# Altium footprint library self_pcblib v1.8.6.PcbLib: 123 footprints (part 1 of 8)
Each footprint in its own frame and in the unit in brackets; x right, y up, seen from the top. Pads: shape width x height; smd on the part's side, far side on the other; paste and mask are expansions set on the pad; w line width, h text height; cw(c..) or ccw(c..) is an arc to the next point about the centre after c.
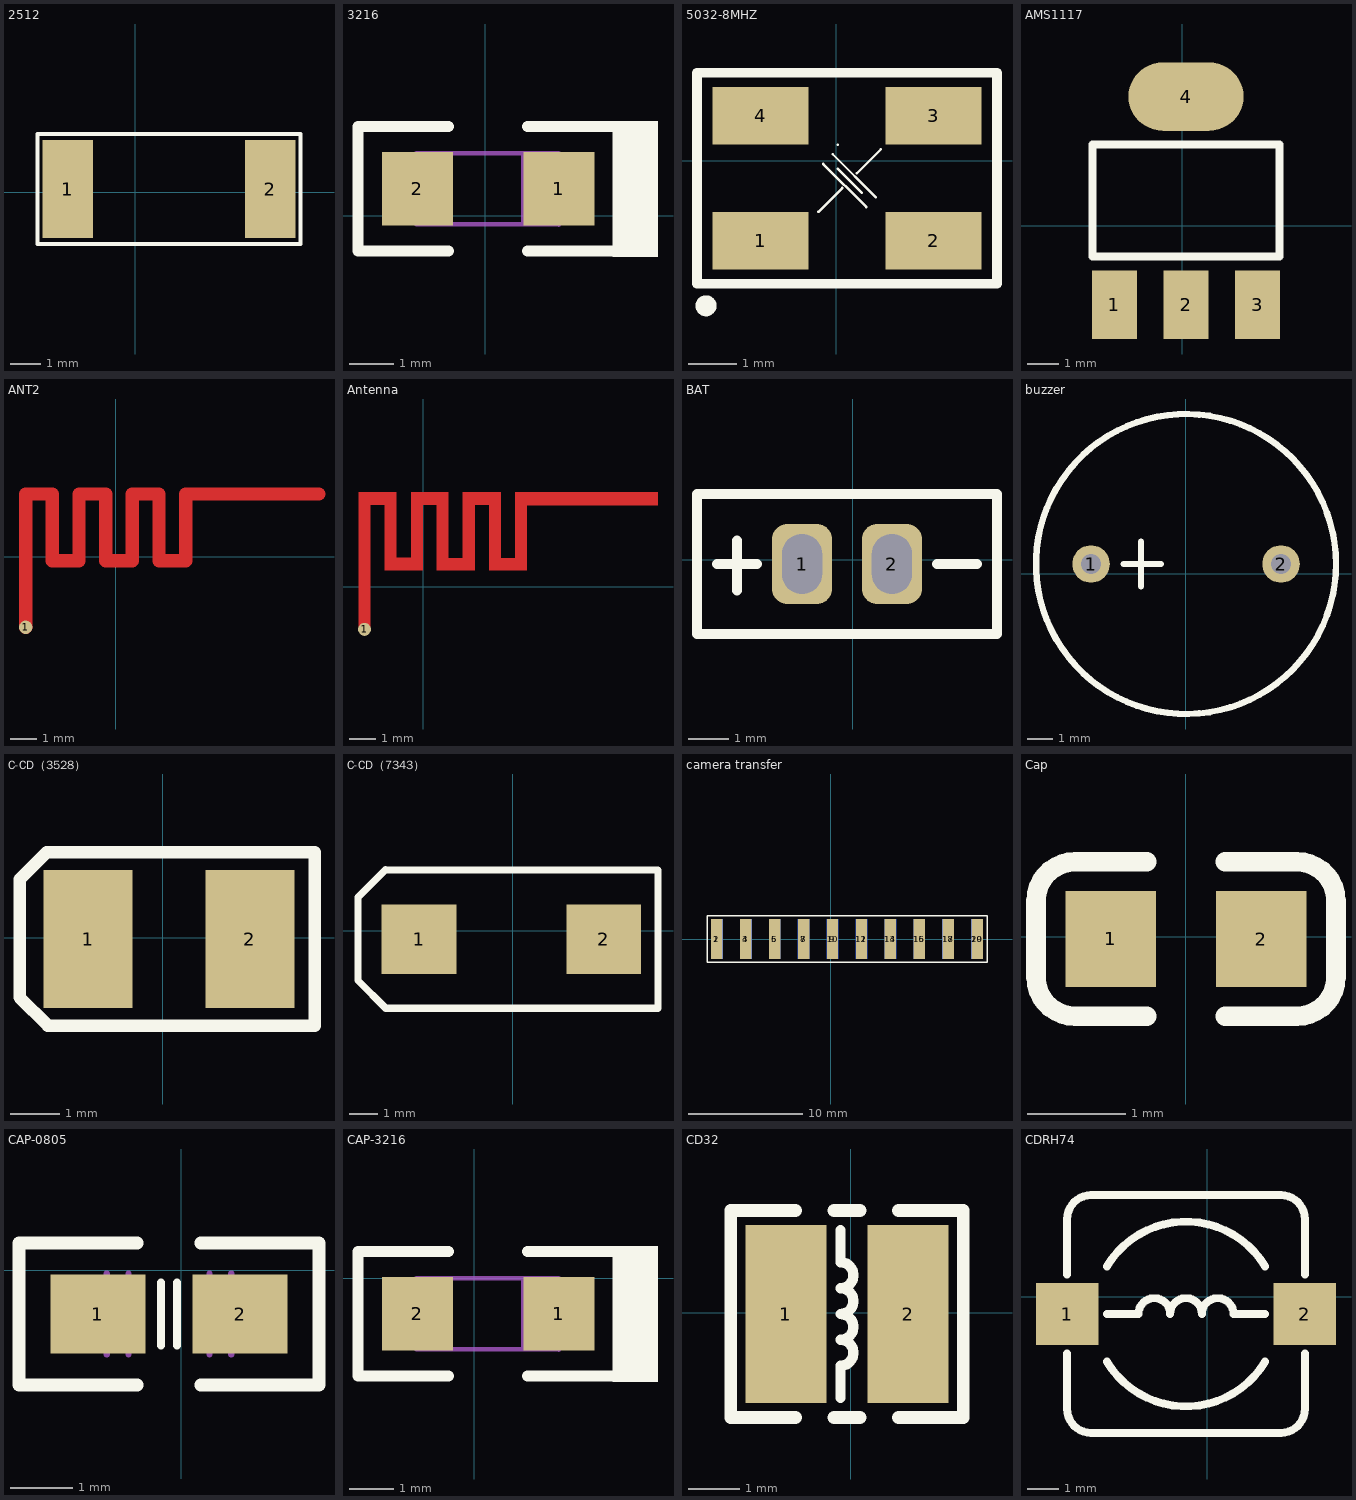
[diagram p0: the footprints below, top view; thin cyan lines are the x and y axes]

## 2512 [mm]
pads (2):
  rect 1.65x3.2 smd: 1(-2.2,0.1) 2(4.4,0.1)
Top Overlay:
  lines w0.127: -3.2,-1.7 5.4,-1.7 5.4,1.9 -3.2,1.9 -3.2,-1.7

## 3216 [mm]
pads (2):
  rect 1.6x1.65 smd: 1(1.659,0.608) 2(-1.516,0.608)
Top Overlay:
  rectangle: 2.866,-0.929 3.882,2.132
  lines w0.254: -0.817,-0.789 -2.849,-0.789 -2.849,2.005 -0.817,2.005 ; 0.961,-0.789 2.866,-0.789 ; 0.961,2.005 2.866,2.005
Mechanical 1:
  lines w0.1: -1.567,-0.002 -1.719,-0.002 -1.719,1.116 -1.541,1.116 ; 0.859,-0.192 0.859,1.408 ; 1.659,-0.205 1.659,-0.027 ; 1.659,-0.192 -1.541,-0.192 -1.541,1.408 1.659,1.408 1.659,-0.027 ; 1.684,1.116 1.862,1.116 1.837,1.091 1.837,-0.027 1.659,-0.027
3D body "3216-_A_钽电容.step": height 1.8, standoff 0, extent -1.692,-0.332 1.708,1.468

## 5032-8MHZ [mm]
pads (4):
  rect 2x1.2 smd: 1(-1.568,-1.667) 2(2.032,-1.667) 3(2.032,0.933) 4(-1.568,0.933)
Top Overlay:
  circle w0.254: c-2.708,-3.023 r0.092
  lines w0.051: -0.368,-1.067 0.132,-0.567 ; -0.268,-0.067 0.632,-0.967 ; -0.068,0.133 0.832,-0.767 ; 0.032,-0.167 0.532,-0.667 ; 0.432,-0.267 0.932,0.233 ; 0.132,-0.567 0.132,-0.567 ; 0.932,0.233 0.932,0.233 ; 0.032,0.333 0.032,0.333
  lines w0.203: -2.896,-2.565 3.353,-2.565 3.353,1.829 -2.896,1.829 -2.896,-2.565
3D body "User Library-crystal_smd_52x34x1.STEP": height 1, standoff 0, extent -2.371,-2.083 2.829,1.317

## AMS1117 [mm]
pads (4):
  rect 1.45x2.2 smd: 1(-2.173,-2.54) 2(0.127,-2.54) 3(2.427,-2.54)
  oval 3.7x2.2 smd: 4(0.127,4.155)
Top Overlay:
  lines w0.254: -2.873,-0.992 3.127,-0.992 3.127,2.607 -2.873,2.607 -2.873,-0.992
3D body "User Library-AMS1117.STEP": height 1.85, standoff -0.01, extent -3.175,-2.763 3.325,4.237

## ANT2 [mm]
pads (1):
  round 0.5 smd: 1(-3.378,-2.642)
Top Layer:
  lines w0.5: -3.378,-2.642 -3.378,2.358 -2.378,2.358 -2.378,-0.142 -1.378,-0.142 -1.378,2.318 ; -1.378,2.358 -0.378,2.358 -0.378,-0.142 0.622,-0.142 0.622,2.348 ; 0.622,2.358 1.622,2.358 1.622,-0.142 2.622,-0.142 2.622,2.358 7.622,2.358

## Antenna [mm]
pads (1):
  round 0.5 smd: 1(-2.261,-1.626)
Top Layer:
  rectangle: 3.505,3.124 8.992,3.632
  rectangle: 2.515,0.635 3.937,1.118
  rectangle: 1.524,3.15 2.946,3.632
  rectangle: 0.508,0.635 1.93,1.118
  rectangle: -0.483,3.15 0.965,3.632
  rectangle: 3.505,0.635 3.962,3.632
  rectangle: 2.515,0.635 2.972,3.632
  rectangle: 1.499,0.635 1.981,3.632
  rectangle: 0.508,0.635 0.965,3.632
  rectangle: -0.483,0.635 -0.025,3.628
  rectangle: -1.499,0.635 -0.025,1.121
  rectangle: -1.499,0.635 -1.041,3.632
  rectangle: -2.489,3.15 -1.067,3.632
  rectangle: -2.489,-1.626 -2.032,3.632

## BAT [mm]
pads (2):
  rrect50% 1.5x2 hole 1 slot 1.5 at 90 deg: 1(-1.27,-0.102) 2(0.976,-0.102)
Top Overlay:
  lines w0.25: -3.397,-0.102 -2.397,-0.102 ; -2.897,-0.77 -2.897,0.48 ; 2.103,-0.102 3.103,-0.102 ; -3.897,-1.852 3.603,-1.852 3.603,1.648 -3.897,1.648 -3.897,-1.852

## buzzer [mm]
pads (2):
  round 1.5 hole 0.8: 1(-3.79,0.381) 2(3.81,0.381)
Top Overlay:
  circle w0.254: c0.009,0.381 r6.001
  lines w0.254: -2.49,0.381 -0.99,0.381 ; -1.79,-0.519 -1.79,1.281
3D body "User Library-WST-1203UX.STEP": height 9.65, standoff -4.5, extent -9.454,-5.822 6,6.178

## C-CD（3528） [mil] "钽电容"
pads (2):
  rect 70.87x110 smd: 1(-59.5,-1) 2(69.5,-1)
Top Overlay:
  lines w10: -114,-47.5 -91.5,-70 121,-70 121,68 -92.5,68 -114,46.5 -114,-47.5
3D body "TAJ-B.STEP": height 74.8, standoff 0, extent -63.9,-56.11 73.9,54.12

## C-CD（7343） [mm] "钽电容"
pads (2):
  rect 2.6x2.4 smd: 1(-3.253,-0.298) 2(3.147,-0.298)
Top Overlay:
  lines w0.254: -4.42,-2.692 5.029,-2.692 5.029,2.083 ; -4.413,-2.693 -5.376,-1.73 -5.376,1.152 -4.42,2.108 5.029,2.101
3D body: height 0.3, standoff 0, extent -3.538,-1.174 -3.442,0.515
3D body: height 0.3, standoff 0, extent 3.257,-1.16 3.461,0.61
3D body "TAJ-D.STEP": height 2.9, standoff 0, extent -3.701,-2.429 3.599,1.871

## camera transfer [mm]
pads (20):
  rect 1x3.5 smd: 1(-10.008,0) 3(-7.468,0) 5(-4.928,0) 7(-2.388,0) 9(0.152,0) 11(2.692,0) 13(5.232,0) 15(7.772,0) 17(10.312,0) 19(12.852,0)
  rect 1x3.5 smd far side: 2(-10.008,0) 4(-7.468,0) 6(-4.928,0) 8(-2.388,0) 10(0.152,0) 12(2.692,0) 14(5.232,0) 16(7.772,0) 18(10.312,0) 20(12.852,0)
Top Overlay:
  lines w0.127: -10.871,-2.057 -10.871,2.057 13.741,2.057 13.741,-2.057 -10.871,-2.057

## Cap [mm]
pads (2):
  rect 0.93x0.98 smd: 1(-0.77,-0.025) 2(0.77,-0.025)
Top Overlay:
  lines w0.2: -0.4,-0.815 -1.135,-0.815 cw(c-1.135,-0.415) -1.535,-0.415 -1.535,0.365 cw(c-1.135,0.365) -1.135,0.765 -0.4,0.765 ; 0.4,-0.815 1.135,-0.815 ccw(c1.135,-0.415) 1.535,-0.415 1.535,0.365 ccw(c1.135,0.365) 1.135,0.765 0.4,0.765
3D body "User Library-0603 SMD Capacitor.STEP": height 0.3, standoff 0, extent -0.8,-0.425 0.8,0.375

## CAP-0805 [mm]
pads (2):
  rect 1.524x1.27 smd: 1(-1.343,-0.7) 2(0.943,-0.7)
Top Overlay:
  lines w0.127: -0.327,-1.208 -0.327,-0.192 ; -0.073,-1.208 -0.073,-0.192
  lines w0.203: -0.708,-1.843 -2.613,-1.843 -2.613,0.443 -0.708,0.443 ; 0.308,-1.843 2.213,-1.843 2.213,0.443 0.308,0.443
Mechanical 1:
  lines w0.1: -1.2,-1.35 -1.2,-0.05 ; -0.85,-1.35 -0.85,-0.05 ; 0.45,-1.35 0.45,-0.05 ; 0.8,-1.35 0.8,-0.05
3D body: height 0.5, standoff 0, extent -1.216,-1.335 -0.835,-0.065
3D body: height 0.5, standoff 0, extent -0.835,-1.335 0.435,-0.065
3D body: height 0.5, standoff 0, extent 0.435,-1.335 0.816,-0.065

## CAP-3216 [mm]
pads (2):
  rect 1.6x1.65 smd: 1(1.905,-0.791) 2(-1.27,-0.791)
Top Overlay:
  rectangle: 3.112,-2.327 4.128,0.733
  lines w0.254: -0.571,-2.188 -2.603,-2.188 -2.603,0.606 -0.571,0.606 ; 1.207,-2.188 3.112,-2.188 ; 1.207,0.606 3.112,0.606
Mechanical 1:
  lines w0.1: -1.321,-1.4 -1.473,-1.4 -1.473,-0.283 -1.295,-0.283 ; 1.105,-1.591 1.105,0.009 ; 1.905,-1.603 1.905,-1.426 ; 1.905,-1.591 -1.295,-1.591 -1.295,0.009 1.905,0.009 1.905,-1.426 ; 1.931,-0.283 2.108,-0.283 2.083,-0.308 2.083,-1.426 1.905,-1.426
3D body "3216-_A_钽电容.step": height 1.8, standoff 0, extent -1.446,-1.73 1.954,0.07

## CD32 [mm]
pads (2):
  rect 1.6x3.5 smd: 1(-1.276,-0.025) 2(1.124,-0.025)
Top Overlay:
  lines w0.203: -0.203,-1.676 -0.203,-1.041 ccw(c-0.203,-0.787) -0.203,-0.533 ccw(c-0.203,-0.279) -0.203,-0.025 ccw(c-0.203,0.229) -0.203,0.483 ccw(c-0.203,0.737) -0.203,0.991 -0.203,1.626
  lines w0.254: -1.092,-2.057 -2.362,-2.057 -2.362,2.007 -1.092,2.007 ; -0.33,-2.057 0.178,-2.057 ; -0.33,2.007 0.178,2.007 ; 0.94,-2.057 2.21,-2.057 2.21,2.007 0.94,2.007
3D body "CD32.STEP": height 2.15, standoff 0.05, extent -1.783,-1.525 1.631,1.475

## CDRH74 [mm] "电感"
pads (2):
  rect 2x2 smd: 1(-4.496,-0.559) 2(3.124,-0.559)
Top Overlay:
  lines w0.254: -4.496,-1.829 -4.496,-3.607 ccw(c-3.734,-3.607) -3.734,-4.369 2.362,-4.369 ccw(c2.362,-3.607) 3.124,-3.607 3.124,-1.829 ; -4.496,0.711 -4.496,2.489 cw(c-3.734,2.489) -3.734,3.251 2.362,3.251 cw(c2.362,2.489) 3.124,2.489 3.124,0.711 ; -3.226,-2.083 ccw(c-0.686,-0.559) 1.854,-2.083 ; -3.226,-0.559 -2.21,-0.559 cw(c-1.702,-0.559) -1.194,-0.559 cw(c-0.686,-0.559) -0.178,-0.559 cw(c0.33,-0.559) 0.838,-0.559 1.854,-0.559 ; -3.226,0.965 cw(c-0.686,-0.559) 1.854,0.965
3D body "CDRH74.STEP": height 4.5, standoff 0, extent -4.336,-4.242 2.964,3.058